# Altium footprint library ACTION_IC封装.PcbLib: 114 footprints (part 6 of 8)
Each footprint in its own frame and in the unit in brackets; x right, y up, seen from the top. Pads: shape width x height; smd on the part's side, far side on the other; paste and mask are expansions set on the pad; w line width, h text height; cw(c..) or ccw(c..) is an arc to the next point about the centre after c.
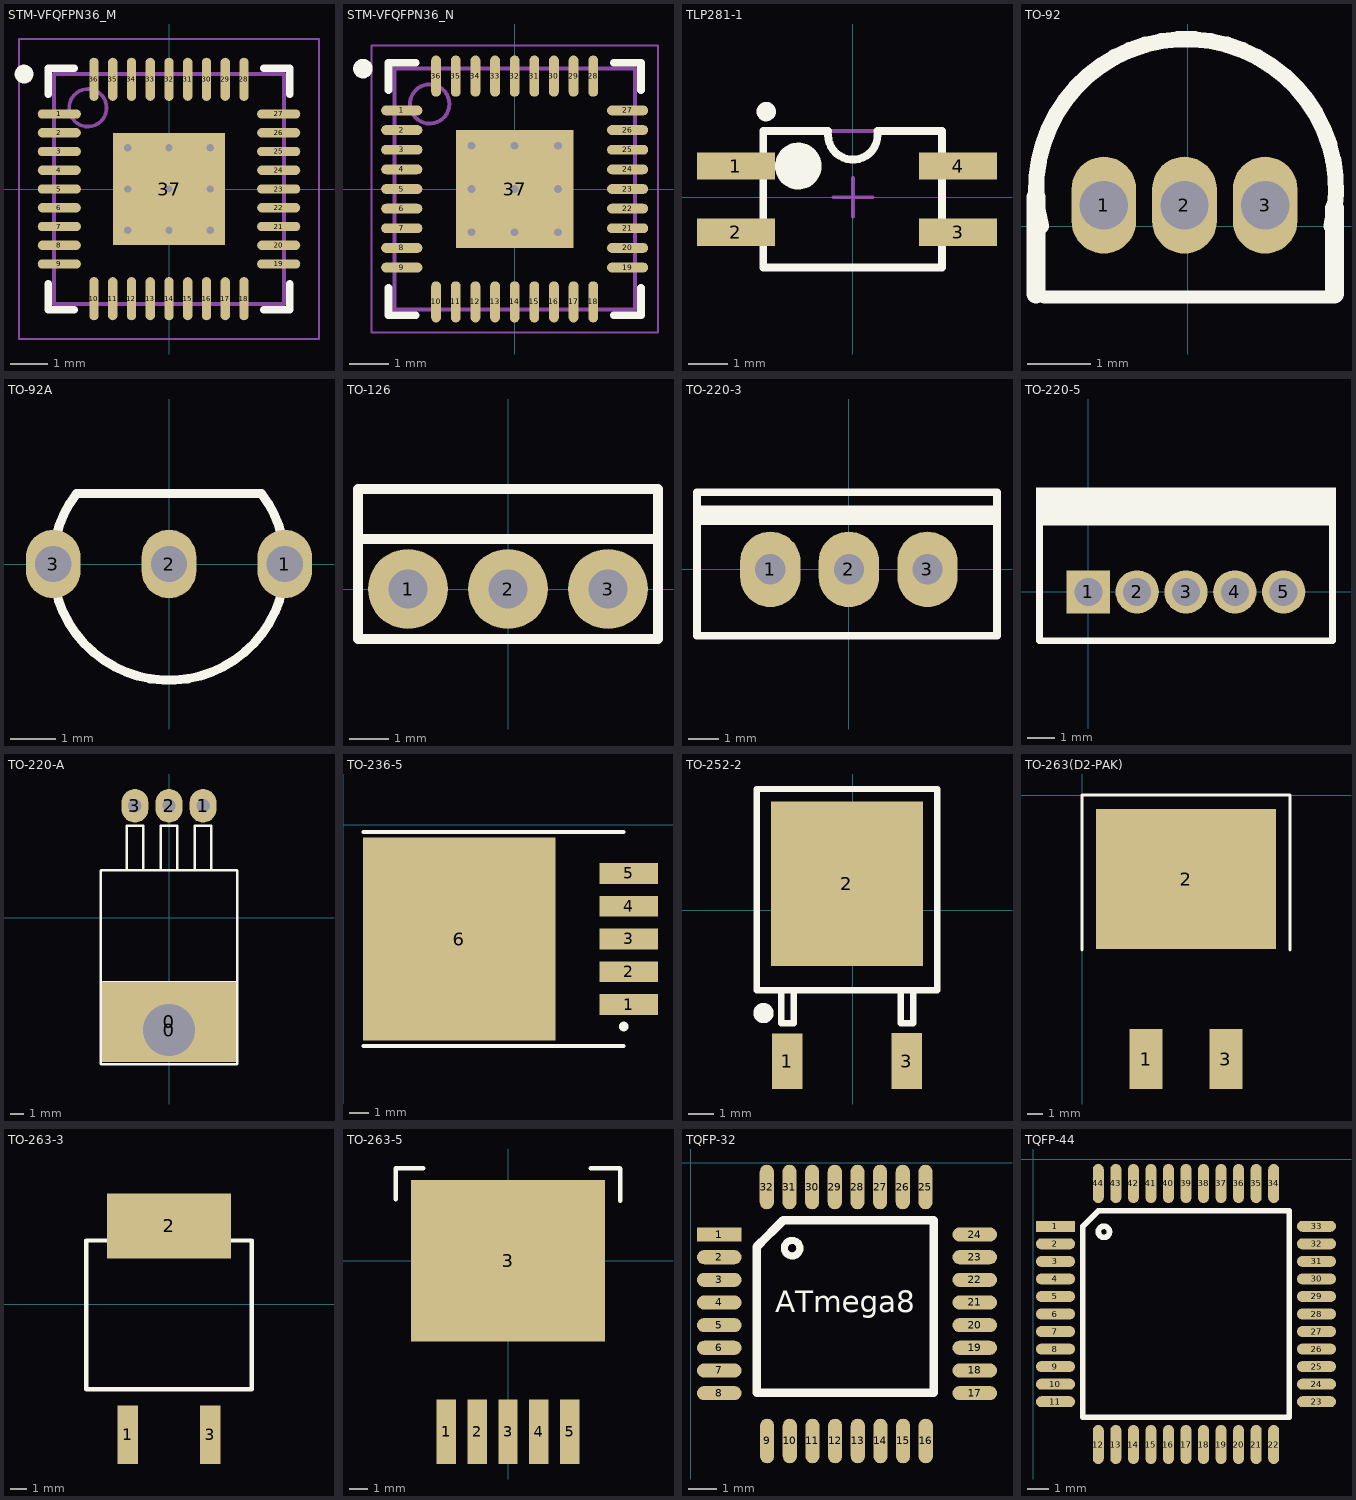
[diagram p5: the footprints below, top view; thin cyan lines are the x and y axes]

## STM-VFQFPN36_M [mm] "QFN, 36-Leads, Body 6.13x6.13mm, Pitch 0.5mm, Thermal Pad 3x3mm, IPC Low Density"
height 1
pads (37):
  oval 1.15x0.25 smd: 1(-2.925,2) 2(-2.925,1.5) 3(-2.925,1) 4(-2.925,0.5) 5(-2.925,0) 6(-2.925,-0.5) 7(-2.925,-1) 8(-2.925,-1.5) 9(-2.925,-2) 19(2.925,-2) 20(2.925,-1.5) 21(2.925,-1) 22(2.925,-0.5) 23(2.925,0) 24(2.925,0.5) 25(2.925,1) 26(2.925,1.5) 27(2.925,2)
  oval 0.25x1.15 smd: 10(-2,-2.925) 11(-1.5,-2.925) 12(-1,-2.925) 13(-0.5,-2.925) 14(0,-2.925) 15(0.5,-2.925) 16(1,-2.925) 17(1.5,-2.925) 18(2,-2.925) 28(2,2.925) 29(1.5,2.925) 30(1,2.925) 31(0.5,2.925) 32(0,2.925) 33(-0.5,2.925) 34(-1,2.925) 35(-1.5,2.925) 36(-2,2.925)
  rect 3x3 smd: 37(0,0)
via 1.1,-1.1 diameter 0.5 hole 0.2
via 0,-1.1 diameter 0.5 hole 0.2
via -1.1,-1.1 diameter 0.5 hole 0.2
via 1.1,0 diameter 0.5 hole 0.2
via 0,0 diameter 0.5 hole 0.2
via -1.1,0 diameter 0.5 hole 0.2
via 1.1,1.1 diameter 0.5 hole 0.2
via 0,1.1 diameter 0.5 hole 0.2
via -1.1,1.1 diameter 0.5 hole 0.2
Top Overlay:
  circle w0.25: c-3.865,3.065 r0.125
  lines w0.2: -3.215,-2.525 -3.215,-3.215 -2.525,-3.215 ; -3.215,2.525 -3.215,3.215 -2.525,3.215 ; 2.525,-3.215 3.215,-3.215 3.215,-2.525 ; 2.525,3.215 3.215,3.215 3.215,2.525
Mechanical 13:
  circle w0.1: c-2.165,2.165 r0.5
  lines w0.1: -3.065,-3.065 3.065,-3.065 3.065,3.065 -3.065,3.065 -3.065,-3.065
Mechanical 15:
  lines w0.05: -4,-4 4,-4 4,4 -4,4 -4,-4
  lines w0.1: -0.5,0 0.5,0 ; 0,-0.5 0,0.5
3D body: height 1, standoff 0, extent -3.065,-3.065 3.065,3.065

## STM-VFQFPN36_N [mm] "QFN, 36-Leads, Body 6.13x6.13mm, Pitch 0.5mm, Thermal Pad 3x3mm, IPC Medium Density"
height 1
pads (37):
  oval 1.05x0.25 smd: 1(-2.875,2) 2(-2.875,1.5) 3(-2.875,1) 4(-2.875,0.5) 5(-2.875,0) 6(-2.875,-0.5) 7(-2.875,-1) 8(-2.875,-1.5) 9(-2.875,-2) 19(2.875,-2) 20(2.875,-1.5) 21(2.875,-1) 22(2.875,-0.5) 23(2.875,0) 24(2.875,0.5) 25(2.875,1) 26(2.875,1.5) 27(2.875,2)
  oval 0.25x1.05 smd: 10(-2,-2.875) 11(-1.5,-2.875) 12(-1,-2.875) 13(-0.5,-2.875) 14(0,-2.875) 15(0.5,-2.875) 16(1,-2.875) 17(1.5,-2.875) 18(2,-2.875) 28(2,2.875) 29(1.5,2.875) 30(1,2.875) 31(0.5,2.875) 32(0,2.875) 33(-0.5,2.875) 34(-1,2.875) 35(-1.5,2.875) 36(-2,2.875)
  rect 3x3 smd: 37(0,0)
via 1.1,-1.1 diameter 0.5 hole 0.2
via 0,-1.1 diameter 0.5 hole 0.2
via -1.1,-1.1 diameter 0.5 hole 0.2
via 1.1,0 diameter 0.5 hole 0.2
via 0,0 diameter 0.5 hole 0.2
via -1.1,0 diameter 0.5 hole 0.2
via 1.1,1.1 diameter 0.5 hole 0.2
via 0,1.1 diameter 0.5 hole 0.2
via -1.1,1.1 diameter 0.5 hole 0.2
Top Overlay:
  circle w0.25: c-3.865,3.065 r0.125
  lines w0.2: -3.215,-2.525 -3.215,-3.215 -2.525,-3.215 ; -3.215,2.525 -3.215,3.215 -2.525,3.215 ; 2.525,-3.215 3.215,-3.215 3.215,-2.525 ; 2.525,3.215 3.215,3.215 3.215,2.525
Mechanical 13:
  circle w0.1: c-2.165,2.165 r0.5
  lines w0.1: -3.065,-3.065 3.065,-3.065 3.065,3.065 -3.065,3.065 -3.065,-3.065
Mechanical 15:
  lines w0.05: -3.65,-3.65 3.65,-3.65 3.65,3.65 -3.65,3.65 -3.65,-3.65
  lines w0.1: -0.5,0 0.5,0 ; 0,-0.5 0,0.5
3D body: height 1, standoff 0, extent -3.065,-3.065 3.065,3.065

## TLP281-1 [mm]
pads (4):
  rect 2x0.7 smd: 1(-3,0.8) 2(-3,-0.9) 3(2.7,-0.9) 4(2.7,0.8)
Top Overlay:
  circle w0.25: c-2.225,2.2 r0.125
  circle w0.6: c-1.4,0.8 r0.3
  lines w0.2: -0.635,1.6 ccw(c0,1.6) 0.635,1.6 ; -0.635,1.7 -2.3,1.7 -2.3,-1.8 2.286,-1.8 2.286,-1.673 2.286,1.7 0.635,1.7
Mechanical 13:
  circle w0.1: c-1.4,0.8 r0.5
  lines w0.1: -2.3,-1.8 -2.3,1.7 2.3,1.7 2.3,-1.8 -2.3,-1.8
Mechanical 15:
  lines w0.1: -0.5,0 0.5,0 ; 0,-0.5 0,0.5
3D body: height 2, standoff 0, extent -2.3,-1.8 2.322,1.7

## TO-92 [mil]
pads (3):
  oval 40x60 hole 30: 1(-52,13) 2(-2,13) 3(48,13)
Top Overlay:
  lines w8: -89,-44 91,-44
  lines w10: -91,0 cw(c-1,23) 89,0
  lines w12: -94,-42 -94,18 ; 91,-42 91,11
3D body "TO-92A.STEP": height 314.96, standoff -118.11, extent -95.49,-51 93.49,103.73

## TO-92A [mm]
height 15.62
pads (3):
  oval 1.2x1.5 hole 0.8: 1(2.54,0) 2(0,0) 3(-2.54,0)
Top Overlay:
  lines w0.2: 0,-0.225 0,0.225 ; 0,0 -0.248,0 0.322,0 ; -2.025,1.55 ccw(c0,0) 2.025,1.55 -2.025,1.55
3D body "TO-92A.step": height 9.7, standoff -1.6, extent -2.76,-2.54 2.77,1.538

## TO-126 [mil]
pads (3):
  round 80 hole 39: 1(-100,0) 2(0,0) 3(100,0)
Top Overlay:
  lines w10: 150,40 150,100 -150,100 -150,50 ; -150,50 150,50 150,-50 -150,-50 -150,50
3D body "TO-126.STEP": height 560.6, standoff -533.89, extent -156.48,-78 158.48,49.96

## TO-220-3 [mm]
pads (3):
  oval 2x2.5 hole 1: 1(-2.6,0) 2(0,0) 3(2.6,0)
Top Overlay:
  rectangle: -5.025,1.47 4.9,2.118
  lines w0.254: -5.025,-2.2 -5.025,2.55 4.9,2.55 4.9,-2.2 -5.025,-2.2
3D body "TO-220A.step": height 19.3, standoff -9.08, extent -4.956,-2.33 4.696,2.17

## TO-220-5 [mil]
pads (5):
  rect 62x62 hole 40: 1(0,0)
  round 62 hole 40: 2(70,0) 3(140,0) 4(210,0) 5(280,0)
Top Overlay:
  rectangle: -75,100 355,150
  lines w10: -70,-70 -70,100 350,100 350,-70 -70,-70
3D body "TO-220-5.STEP": height 269.78, standoff -143.39, extent -58.04,-786.01 342.04,8

## TO-220-A [mm]
pads (5):
  rect 10x6 smd: 0(0,-7.759)
  round 2 hole 3.88: 0(0,-8.37)
  oval 2x2.5 hole 1: 1(2.54,8.37) 2(0,8.37) 3(-2.54,8.37)
Top Overlay:
  lines w0.2: -5.08,-10.86 -5.08,-4.86 ; -5.08,-4.76 -5.08,3.52 ; -5.03,-10.91 5.03,-10.91 ; -5.03,-4.81 5.03,-4.81 ; -5.03,3.57 5.03,3.57 ; -3.15,3.57 -3.15,6.87 -1.93,6.87 -1.93,3.57 ; -0.61,3.57 -0.61,6.87 0.61,6.87 0.61,3.57 ; 1.93,3.57 1.93,6.87 3.15,6.87 3.15,3.57 ; 5.08,-10.86 5.08,-4.86 ; 5.08,-4.76 5.08,3.52
3D body "TO-220.step": height 4.45, standoff -1.79, extent -5.01,-10.69 5.15,8.59

## TO-236-5 [mil]
height 177.17
pads (6):
  rect 120x42 smd: 1(583.28,-367.4) 2(583.28,-300.47) 3(583.28,-233.54) 4(583.28,-166.61) 5(583.28,-99.68)
  rect 393.7x414 smd: 6(237.28,-233.54)
Top Overlay:
  circle w9.84: c573.28,-412.32 r4.92
  lines w7.87: 41.79,-452.04 573.28,-452.04 ; 41.79,-15.03 573.28,-15.03
3D body "TO263-5.STEP": height 175.3, standoff -13.67, extent 15,-429.85 631.93,-36.15

## TO-252-2 [mm]
pads (3):
  rect 1.2x2.2 smd: 1(-2.59,-5.969) 3(2.133,-5.965)
  rect 6x6.5 smd: 2(-0.229,1.031)
Top Overlay:
  circle w0.4: c-3.529,-4.069 r0.2
  lines w0.254: -2.829,-3.169 -2.829,-4.469 -2.329,-4.469 -2.329,-3.169 ; 1.894,-3.165 1.894,-4.465 2.394,-4.465 2.394,-3.165 ; -3.802,-3.169 -3.802,4.781 3.344,4.781 3.344,-3.169 -3.802,-3.169
3D body "TO-252.STEP": height 2.44, standoff 0.03, extent -3.499,-6.169 3.041,3.769

## TO-263(D2-PAK) [mil]
pads (3):
  rect 82x150 smd: 1(160,-660) 3(360,-660)
  rect 450x350 smd: 2(260,-210)
Top Overlay:
  lines w8: 0,-387 0,0 520,0 520,-387.01
3D body "SW3dPS-DPAK.STEP": height 193.9, standoff -3.66, extent 61,-638.71 461,-37.78

## TO-263-3 [mm]
height 1.1
pads (3):
  rect 1.25x3.6 smd: 1(8.255,-8.001) 3(13.335,-8.001)
  rect 7.6x4 smd: 2(10.795,4.826)
Top Overlay:
  lines w0.254: 5.715,-5.207 15.875,-5.207 15.875,3.937 5.715,3.937 5.715,-5.207
3D body "User Library-DPAK.step": height 4.88, standoff -0.13, extent 5.715,-9.041 15.875,6.223

## TO-263-5 [mil]
pads (6):
  rect 42x140 smd: 1(-134,-370) 2(-67,-370) 3(0,-370) 4(67,-370) 5(134,-370)
  rect 420x350 smd: 3(0,0)
Top Overlay:
  lines w10: -243,134 -243,201 -184,201 ; 179,201 242,201 243,200 243,130
3D body "TO263-5.STEP": height 185.3, standoff -3.67, extent -192.7,-424.47 201,192.47

## TQFP-32 [mil]
pads (32):
  rect 62x19.68 smd: 1(40,-100)
  oval 62x19.68 smd: 2(40,-131.5) 3(40,-162.99) 4(40,-194.49) 5(40,-225.98) 6(40,-257.48) 7(40,-288.98) 8(40,-320.47) 17(395,-320.47) 18(395,-288.98) 19(395,-257.48) 20(395,-225.98) 21(395,-194.49) 22(395,-162.99) 23(395,-131.5) 24(395,-100)
  oval 19.68x62 smd: 9(106.51,-387) 10(138.01,-387) 11(169.5,-387) 12(201,-387) 13(232.5,-387) 14(263.99,-387) 15(295.49,-387) 16(326.98,-387) 25(326.52,-33.95) 26(295.02,-33.95) 27(263.53,-33.95) 28(232.03,-33.95) 29(200.53,-33.95) 30(169.04,-33.95) 31(137.54,-33.95) 32(106.05,-33.95)
Top Overlay:
  circle w10: c141.23,-119 r10.77
  lines w12: 93,-116 129,-80 338,-80 338,-320 92,-320 92,-117 98.99,-110.01
  text "ATmega8" at 118,-208 h30
3D body "TQFP-9X9-32.STEP": height 62.99, standoff -1.97, extent 39.84,-387.33 394.16,-33

## TQFP-44 [mil]
pads (44):
  rect 70x19.68 smd: 1(40,-120)
  oval 70x19.68 smd: 2(40,-151.5) 3(40,-182.99) 4(40,-214.49) 5(40,-245.98) 6(40,-277.48) 7(40,-308.98) 8(40,-340.47) 9(40,-371.97) 10(40,-403.46) 11(40,-434.96) 23(508.5,-434.96) 24(508.5,-403.46) 25(508.5,-371.97) 26(508.5,-340.47) 27(508.5,-308.98) 28(508.5,-277.48) 29(508.5,-245.98) 30(508.5,-214.49) 31(508.5,-182.99) 32(508.5,-151.5) 33(508.5,-120)
  oval 19.68x70 smd: 12(116.77,-511.73) 13(148.27,-511.73) 14(179.76,-511.73) 15(211.26,-511.73) 16(242.76,-511.73) 17(274.25,-511.73) 18(305.75,-511.73) 19(337.24,-511.73) 20(368.74,-511.73) 21(400.24,-511.73) 22(431.73,-511.73) 34(431.73,-43.23) 35(400.24,-43.23) 36(368.74,-43.23) 37(337.24,-43.23) 38(305.75,-43.23) 39(274.25,-43.23) 40(242.76,-43.23) 41(211.26,-43.23) 42(179.76,-43.23) 43(148.27,-43.23) 44(116.77,-43.23)
Top Overlay:
  circle w10: c126.95,-130 r10.05
  lines w9.84: 89.21,-462.52 459.29,-462.52 459.29,-92.44
  lines w10: 89.21,-462.52 89.21,-120 116.77,-92.44 459.29,-92.44
3D body "TQFP-44.STEP": height 42.69, standoff -1.02, extent 39.79,-515.21 512.23,-42.77